# Altium footprint library RcMPPTLib.PcbLib: 82 footprints (part 1 of 6)
Each footprint in its own frame and in the unit in brackets; x right, y up, seen from the top. Pads: shape width x height; smd on the part's side, far side on the other; paste and mask are expansions set on the pad; w line width, h text height; cw(c..) or ccw(c..) is an arc to the next point about the centre after c.
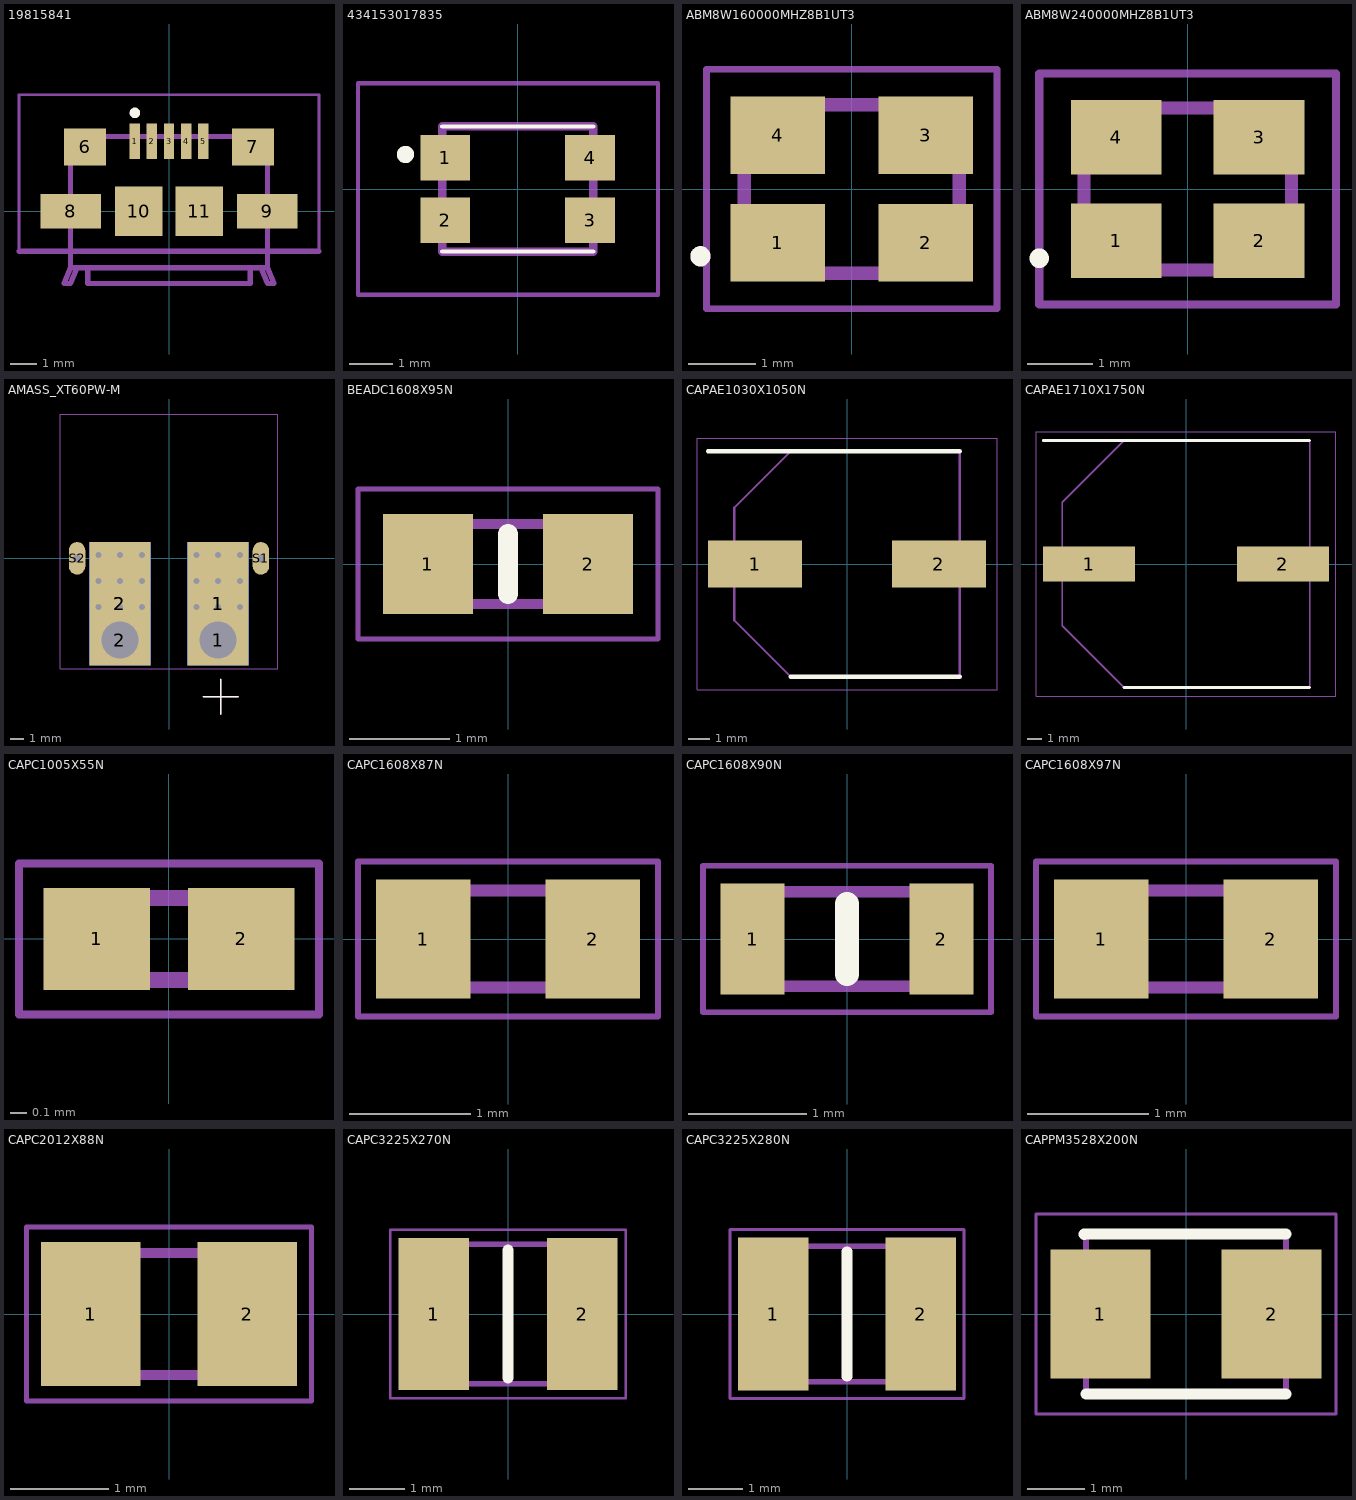
[diagram p0: the footprints below, top view; thin cyan lines are the x and y axes]

## 19815841 [mm]
pads (11):
  rect 0.4x1.35 smd: 1(-1.3,2.675) 2(-0.65,2.675) 3(0,2.675) 4(0.65,2.675) 5(1.3,2.675)
  rect 1.6x1.4 smd: 6(-3.2,2.45) 7(3.2,2.45)
  rect 2.3x1.3 smd: 8(-3.75,0) 9(3.75,0)
  rect 1.8x1.9 smd: 10(-1.15,0) 11(1.15,0)
Top Overlay:
  lines w0.2: -1.4,3.75 cw(c-1.3,3.75) -1.2,3.75 cw(c-1.3,3.75) -1.4,3.75
Mechanical 13:
  lines w0.2: -5.715,-1.524 5.715,-1.524 ; -3.5,-2.15 -3.75,-2.75 -4,-2.75 -3.75,-2.15 ; -3.1,-2.15 -3.1,-2.75 3.1,-2.75 3.1,-2.15 ; 3.5,-2.15 3.75,-2.75 4,-2.75 3.75,-2.15 ; -3.75,-2.15 -3.75,2.85 3.75,2.85 3.75,-2.15 ; -3.75,-2.15 3.75,-2.15
Mechanical 15:
  lines w0.1: -5.715,-1.524 -5.715,4.445 5.715,4.445 5.715,-1.524 -5.715,-1.524
3D body "1981584-1.stp": height 2.8, standoff -0.26, extent -4.4,-2.925 4.4,2.675

## 434153017835 [mm]
pads (4):
  rect 1.15x1.05 smd: 1(-1.675,0.725) 2(-1.675,-0.725) 3(1.675,-0.725) 4(1.675,0.725)
Top Overlay:
  circle w0.2: c-2.6,0.8 r0.1
  circle w0.2: c-2.6,0.8 r0.1
  lines w0.1: -1.75,-1.45 1.75,-1.45 ; -1.75,1.45 1.75,1.45
Mechanical 13:
  lines w0.2: -1.75,-1.45 -1.75,1.45 1.75,1.45 1.75,-1.45 -1.75,-1.45
Mechanical 15:
  lines w0.1: -3.7,-2.45 -3.7,2.45 3.25,2.45 3.25,-2.45 -3.7,-2.45
3D body "434153017835.stp": height 1.1, standoff 0, extent -2.145,-1.45 2.145,1.45

## ABM8W160000MHZ8B1UT3 [mm]
pads (4):
  rect 1.4x1.15 smd: 1(-1.1,-0.8) 2(1.1,-0.8) 3(1.1,0.8) 4(-1.1,0.8)
Top Overlay:
  lines w0.2: -2.3,-1 cw(c-2.25,-1) -2.2,-1 cw(c-2.25,-1) -2.3,-1
Mechanical 13:
  lines w0.2: -1.6,-1.25 1.6,-1.25 1.6,1.25 -1.6,1.25 -1.6,-1.25
Mechanical 15:
  lines w0.1: -2.159,-1.778 2.159,-1.778 2.159,1.778 -2.159,1.778 -2.159,-1.778
3D body "ABM8W-16.0000MHZ-8-B1U-T3.stp": height 0.85, standoff 0, extent -1.685,-1.26 1.685,1.26

## ABM8W240000MHZ8B1UT3 [mm]
pads (4):
  rect 1.4x1.15 smd: 1(-1.1,-0.8) 2(1.1,-0.8) 3(1.1,0.8) 4(-1.1,0.8)
Top Overlay:
  lines w0.2: -2.286,-1.116 cw(c-2.286,-1.066) -2.286,-1.016 cw(c-2.286,-1.066) -2.286,-1.116
Mechanical 13:
  lines w0.2: -1.6,-1.25 1.6,-1.25 1.6,1.25 -1.6,1.25 -1.6,-1.25
Mechanical 15:
  lines w0.127: -2.286,-1.778 -2.286,1.778 2.286,1.778 2.286,-1.778 -1.524,-1.778 -2.286,-1.778
3D body "ABM8W-24.0000MHZ-8-B1U-T3.stp": height 0.85, standoff 0, extent -1.685,-1.26 1.685,1.26

## AMASS_XT60PW-M [mm]
pads (8):
  rect 3.716x3.716 hole 2.7: 1(3.6,-6)
  rect 4.5x9.058 smd: 1(3.6,-3.329) 2(-3.6,-3.329)
  rect 4.5x9.058 smd far side: 1(3.6,-3.329) 2(-3.6,-3.329)
  round 3.716 hole 2.7: 2(-3.6,-6)
  oval 1.2x2.4 hole 0.6 square: S1(6.75,0) S2(-6.75,0)
via 2.032,0.254 diameter 0.85 hole 0.45
via 5.207,0.254 diameter 0.85 hole 0.45
via 3.6,0.254 diameter 0.85 hole 0.45
via 2.032,-1.651 diameter 0.85 hole 0.45
via 5.207,-1.651 diameter 0.85 hole 0.45
via 3.6,-1.651 diameter 0.85 hole 0.45
via 2.032,-3.583 diameter 0.85 hole 0.45
via 5.207,-3.583 diameter 0.85 hole 0.45
via 3.6,-3.583 diameter 0.85 hole 0.45
via -5.168,0.254 diameter 0.85 hole 0.45
via -1.993,0.254 diameter 0.85 hole 0.45
via -3.6,0.254 diameter 0.85 hole 0.45
via -5.168,-1.651 diameter 0.85 hole 0.45
via -1.993,-1.651 diameter 0.85 hole 0.45
via -3.6,-1.651 diameter 0.85 hole 0.45
via -5.168,-3.583 diameter 0.85 hole 0.45
via -1.993,-3.583 diameter 0.85 hole 0.45
via -3.6,-3.583 diameter 0.85 hole 0.45
Top Overlay:
  lines w0.127: 2.54,-10.16 3.81,-10.16 ; 3.81,-11.43 3.81,-10.16 ; 3.81,-8.89 3.81,-10.16 ; 5.08,-10.16 3.81,-10.16
Mechanical 13:
  lines w0.127: 2.54,-10.16 3.81,-10.16 ; 3.81,-11.43 3.81,-10.16 ; 3.81,-8.89 3.81,-10.16 ; 5.08,-10.16 3.81,-10.16
Mechanical 15:
  lines w0.05: -8,-8.11 8,-8.11 8,10.6 -8,10.6 -8,-8.11
3D body "step_temp.STEP": height 8.4, standoff -2.55, extent -7.75,-7.874 7.75,10.326

## BEADC1608X95N [mm]
pads (2):
  rect 0.9x1 smd: 1(-0.8,0) 2(0.8,0)
Top Overlay:
  lines w0.2: 0,-0.3 0,0.3
Mechanical 13:
  lines w0.1: -0.8,-0.4 0.8,-0.4 0.8,0.4 -0.8,0.4 -0.8,-0.4
Mechanical 15:
  lines w0.05: -1.5,-0.75 1.5,-0.75 1.5,0.75 -1.5,0.75 -1.5,-0.75
3D body "MPZ1608S221A.stp": height 0.95, standoff 0, extent -0.8,-0.4 0.8,0.4

## CAPAE1030X1050N [mm]
pads (2):
  rect 4.3x2.15 smd: 1(-4.2,0) 2(4.2,0)
Top Overlay:
  lines w0.2: -6.35,5.15 5.15,5.15 ; -2.575,-5.15 5.15,-5.15
Mechanical 13:
  lines w0.1: -5.15,-2.575 -5.15,2.575 -2.575,5.15 5.15,5.15 5.15,-5.15 -2.575,-5.15 -5.15,-2.575
Mechanical 15:
  lines w0.05: -6.85,-5.75 6.85,-5.75 6.85,5.75 -6.85,5.75 -6.85,-5.75
3D body "UUX2A470MNL1GS.stp": height 10.5, standoff 0, extent -5.65,-5.25 5.65,5.25

## CAPAE1710X1750N [mm]
pads (2):
  rect 6.35x2.4 smd: 1(-6.7,0) 2(6.7,0)
Top Overlay:
  lines w0.2: -9.875,8.55 8.55,8.55 ; -4.275,-8.55 8.55,-8.55
Mechanical 13:
  lines w0.1: -8.55,-4.275 -4.275,-8.55 8.55,-8.55 8.55,8.55 -4.275,8.55 -8.55,4.275 -8.55,-4.275
Mechanical 15:
  lines w0.05: -10.375,-9.15 -10.375,9.15 10.375,9.15 10.375,-9.15 -10.375,-9.15
3D body "UCD2A101MNQ1MS.stp": height 17.5, standoff 0, extent -9.15,-8.65 9.15,8.65

## CAPC1005X55N [mm]
pads (2):
  rect 0.65x0.62 smd: 1(-0.44,0) 2(0.44,0)
Mechanical 13:
  lines w0.1: -0.5,-0.25 0.5,-0.25 0.5,0.25 -0.5,0.25 -0.5,-0.25
Mechanical 15:
  lines w0.05: -0.915,-0.46 0.915,-0.46 0.915,0.46 -0.915,0.46 -0.915,-0.46
3D body "C0402C689C5GACAUTO.stp": height 0.55, standoff 0, extent -0.5,-0.25 0.5,0.25

## CAPC1608X87N [mm]
pads (2):
  rect 0.78x0.98 smd: 1(-0.7,0) 2(0.7,0)
Mechanical 13:
  lines w0.1: -0.8,-0.4 0.8,-0.4 0.8,0.4 -0.8,0.4 -0.8,-0.4
Mechanical 15:
  lines w0.05: -1.24,-0.64 1.24,-0.64 1.24,0.64 -1.24,0.64 -1.24,-0.64
3D body "C0603C689C5GACTU.stp": height 0.87, standoff 0, extent -0.8,-0.4 0.8,0.4

## CAPC1608X90N [mm]
pads (2):
  rect 0.54x0.94 smd: 1(-0.8,0) 2(0.8,0)
Top Overlay:
  lines w0.2: 0,-0.3 0,0.3
Mechanical 13:
  lines w0.1: -0.8,-0.4 -0.8,0.4 0.8,0.4 0.8,-0.4 -0.8,-0.4
Mechanical 15:
  lines w0.05: -1.22,-0.62 -1.22,0.62 1.22,0.62 1.22,-0.62 -1.22,-0.62
3D body "C1608X5R1E335K080AC.stp": height 0.9, standoff 0, extent -0.8,-0.4 0.8,0.4

## CAPC1608X97N [mm]
pads (2):
  rect 0.78x0.98 smd: 1(-0.7,0) 2(0.7,0)
Mechanical 13:
  lines w0.1: -0.8,-0.4 0.8,-0.4 0.8,0.4 -0.8,0.4 -0.8,-0.4
Mechanical 15:
  lines w0.05: -1.24,-0.64 1.24,-0.64 1.24,0.64 -1.24,0.64 -1.24,-0.64
3D body "VJ0603Y104JXJAC.stp": height 0.97, standoff 0, extent -0.8,-0.4 0.8,0.4

## CAPC2012X88N [mm]
pads (2):
  rect 1.02x1.47 smd: 1(-0.8,0) 2(0.8,0)
Mechanical 13:
  lines w0.1: -1,-0.625 1,-0.625 1,0.625 -1,0.625 -1,-0.625
Mechanical 15:
  lines w0.05: -1.46,-0.89 1.46,-0.89 1.46,0.89 -1.46,0.89 -1.46,-0.89
3D body "C0805C689C5GACTU.stp": height 0.88, standoff 0, extent -1,-0.625 1,0.625

## CAPC3225X270N [mm]
pads (2):
  rect 1.26x2.72 smd: 1(-1.33,0) 2(1.33,0)
Top Overlay:
  lines w0.2: 0,-1.15 0,1.15
Mechanical 13:
  lines w0.1: -1.6,-1.25 -1.6,1.25 1.6,1.25 1.6,-1.25 -1.6,-1.25
Mechanical 15:
  lines w0.05: -2.11,-1.51 -2.11,1.51 2.11,1.51 2.11,-1.51 -2.11,-1.51
3D body "GRM32EC72A106KE05L.stp": height 2.7, standoff 0, extent -1.6,-1.25 1.6,1.25

## CAPC3225X280N [mm]
pads (2):
  rect 1.3x2.82 smd: 1(-1.36,0) 2(1.36,0)
Top Overlay:
  lines w0.2: 0,-1.15 0,1.15
Mechanical 13:
  lines w0.1: -1.6,-1.25 1.6,-1.25 1.6,1.25 -1.6,1.25 -1.6,-1.25
Mechanical 15:
  lines w0.05: -2.16,-1.56 2.16,-1.56 2.16,1.56 -2.16,1.56 -2.16,-1.56
3D body "CL32B106KMVNNWE.stp": height 2.8, standoff 0, extent -1.6,-1.25 1.6,1.25

## CAPPM3528X200N [mm]
pads (2):
  rect 1.75x2.25 smd: 1(-1.5,0) 2(1.5,0)
Top Overlay:
  lines w0.2: -1.778,1.397 1.75,1.4 ; -1.75,-1.4 1.75,-1.4
Mechanical 13:
  lines w0.1: -1.75,-1.4 -1.75,1.4 1.75,1.4 1.75,-1.4 -1.75,-1.4
Mechanical 15:
  lines w0.05: -2.625,-1.75 -2.625,1.75 2.625,1.75 2.625,-1.75 -2.625,-1.75
3D body "8TPE100MAZB.stp": height 2, standoff 0, extent -1.75,-1.4 1.75,1.4